# Altium footprint library 04.连接器件.pcb.PCBLIB: 363 footprints (part 12 of 23)
Each footprint in its own frame and in the unit in brackets; x right, y up, seen from the top. Pads: shape width x height; smd on the part's side, far side on the other; paste and mask are expansions set on the pad; w line width, h text height; cw(c..) or ccw(c..) is an arc to the next point about the centre after c.
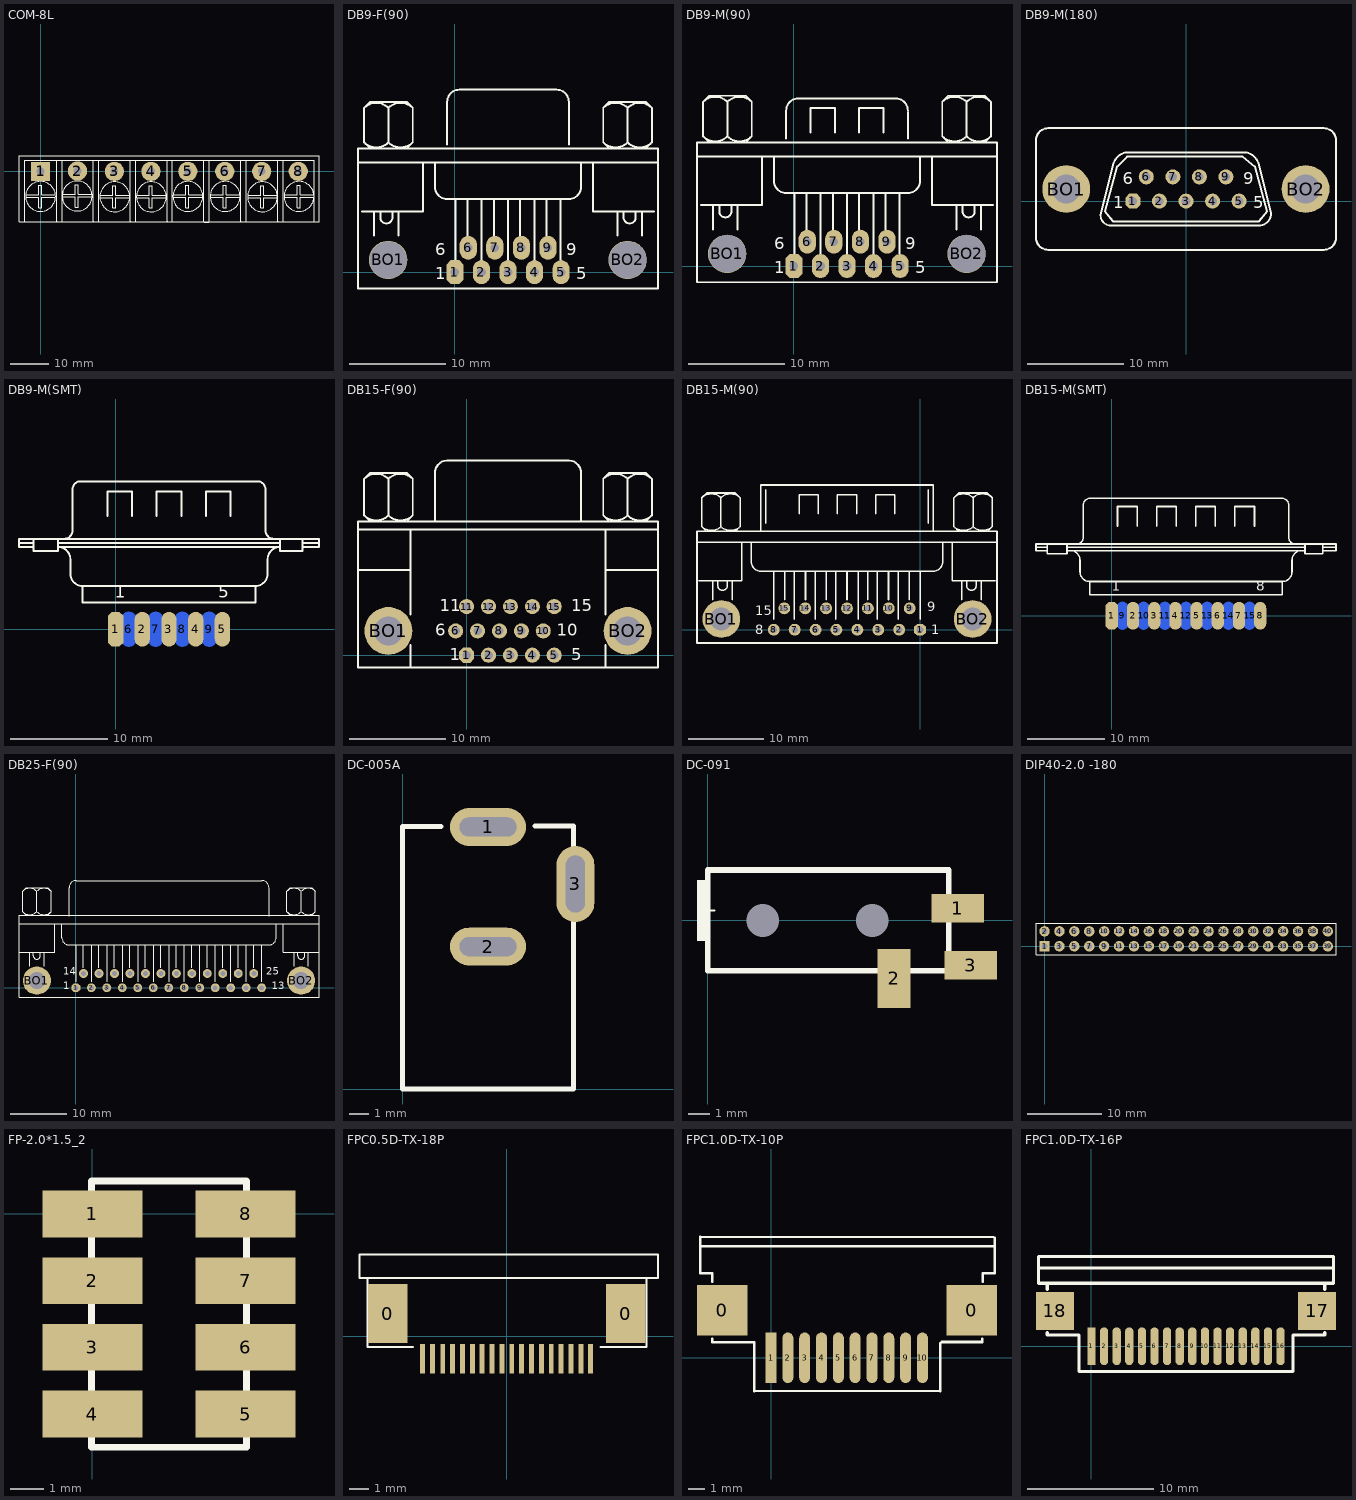
[diagram p11: the footprints below, top view; thin cyan lines are the x and y axes]

## COM-8L [mm]
pads (8):
  rect 5x5 hole 2: 1(0,0)
  round 5 hole 2: 2(9.6,0.1) 3(19.2,0) 4(28.7,0) 5(38.3,0) 6(47.9,0) 7(57.5,0) 8(67,0)
TopOverlay:
  drawing of 177 lines, arcs and shapes, not listed

## DB9-F(90) [mm]
pads (11):
  oct 1.8x2.5 hole 0.9: 1(0,0)
  oval 1.8x2.5 hole 0.9: 2(2.773,0) 3(5.546,0) 4(8.318,0) 5(11.091,0) 6(1.397,2.54) 7(4.17,2.54) 8(6.943,2.54) 9(9.715,2.54)
  round 4 hole 3.9: BO1(-6.964,1.27) BO2(18.034,1.27)
TopOverlay:
  lines w0.203: -10.118,11.43 21.209,11.43 ; -9.694,6.35 -3.344,6.35 -3.344,11.43 ; -9.485,13.544 ccw(c-8.213,14.817) -6.94,13.544 ; -9.485,17.147 cw(c-8.213,15.875) -6.94,17.147 ; -8.848,12.912 -9.483,13.547 -9.483,17.145 -8.848,17.78 -5.038,17.78 -4.403,17.145 -4.403,13.547 -5.038,12.912 ; -8.424,3.81 -8.424,6.35 ; -7.789,6.35 -7.789,5.715 ccw(c-7.154,5.715) -6.519,5.715 -6.519,6.35 ; -6.945,13.544 ccw(c-5.673,14.817) -4.4,13.544 ; -6.945,17.147 cw(c-5.673,15.875) -4.4,17.147 ; -6.943,13.547 -6.943,17.145 ; -5.884,3.81 -5.884,6.35 ; -2.074,11.43 -2.074,8.89 ccw(c-0.804,8.89) -0.804,7.62 11.896,7.62 ccw(c11.896,8.89) 13.166,8.89 13.166,11.43 ; -0.804,13.335 -0.804,17.78 cw(c0.466,17.78) 0.466,19.05 10.626,19.05 cw(c10.626,17.78) 11.896,17.78 11.896,13.335 ; 0.042,1.27 0.042,7.62 ; 1.312,3.81 1.312,7.62 ; 2.794,1.27 2.794,7.62 ; 4.064,3.81 4.064,7.62 ; 5.546,1.27 5.546,7.62 ; 6.816,3.81 6.816,7.62 ; 8.297,1.27 8.297,7.62 ; 9.567,3.81 9.567,7.62 ; 11.049,1.27 11.049,7.62 ; 14.436,11.43 14.436,6.35 20.786,6.35 ; 15.492,13.544 ccw(c16.764,14.817) 18.036,13.544 ; 15.492,17.147 cw(c16.764,15.875) 18.036,17.147 ; 16.129,12.912 15.494,13.547 15.494,17.145 16.129,17.78 19.939,17.78 20.574,17.145 20.574,13.547 19.939,12.912 ; 16.976,3.81 16.976,6.35 ; 17.611,6.35 17.611,5.715 ccw(c18.246,5.715) 18.881,5.715 18.881,6.35 ; 18.032,13.544 ccw(c19.304,14.817) 20.576,13.544 ; 18.032,17.147 cw(c19.304,15.875) 20.576,17.147 ; 18.034,13.547 18.034,17.145 ; 19.516,3.81 19.516,6.35 ; -10.118,-1.693 -10.118,12.912 21.209,12.912 21.209,-1.693 -10.118,-1.693
  text "6" at -2.074,1.778 h1.27
  text "1" at -2.074,-0.762 h1.27
  text "5" at 12.658,-0.762 h1.27
  text "9" at 11.642,1.778 h1.27
3D body "DB9-FL.STEP": height 12.55, standoff -3, extent -10.058,-1.727 21.252,16.673

## DB9-M(90) [mm]
pads (11):
  oct 1.8x2.5 hole 0.9: 1(0,0)
  oval 1.8x2.5 hole 0.9: 2(2.773,0) 3(5.546,0) 4(8.318,0) 5(11.091,0) 6(1.397,2.54) 7(4.17,2.54) 8(6.943,2.54) 9(9.715,2.54)
  round 4 hole 3.9: BO1(-6.964,1.27) BO2(18.034,1.27)
TopOverlay:
  lines w0.203: -10.118,11.43 21.209,11.43 ; -9.694,6.35 -3.344,6.35 -3.344,11.43 ; -9.485,13.544 ccw(c-8.213,14.817) -6.94,13.544 ; -9.485,17.147 cw(c-8.213,15.875) -6.94,17.147 ; -8.848,12.912 -9.483,13.547 -9.483,17.145 -8.848,17.78 -5.038,17.78 -4.403,17.145 -4.403,13.547 -5.038,12.912 ; -8.424,3.81 -8.424,6.35 ; -7.789,6.35 -7.789,5.715 ccw(c-7.154,5.715) -6.519,5.715 -6.519,6.35 ; -6.945,13.544 ccw(c-5.673,14.817) -4.4,13.544 ; -6.945,17.147 cw(c-5.673,15.875) -4.4,17.147 ; -6.943,13.547 -6.943,17.145 ; -5.884,3.81 -5.884,6.35 ; -2.074,11.43 -2.074,8.89 ccw(c-0.804,8.89) -0.804,7.62 11.896,7.62 ccw(c11.896,8.89) 13.166,8.89 13.166,11.43 ; -0.804,13.335 -0.804,16.231 cw(c0.466,16.231) 0.466,17.501 10.626,17.501 cw(c10.626,16.231) 11.896,16.231 ; 0.042,1.27 0.042,7.62 ; 1.312,3.81 1.312,7.62 ; 1.736,13.966 1.736,16.506 4.276,16.506 4.276,13.966 ; 2.794,1.27 2.794,7.62 ; 4.064,3.81 4.064,7.62 ; 5.546,1.27 5.546,7.62 ; 6.816,3.81 6.816,7.62 ; 6.816,13.966 6.816,16.506 9.356,16.506 9.356,13.966 ; 8.297,1.27 8.297,7.62 ; 9.567,3.81 9.567,7.62 ; 11.049,1.27 11.049,7.62 ; 11.896,13.335 11.896,16.104 ; 14.436,11.43 14.436,6.35 20.786,6.35 ; 15.492,13.544 ccw(c16.764,14.817) 18.036,13.544 ; 15.492,17.147 cw(c16.764,15.875) 18.036,17.147 ; 16.129,12.912 15.494,13.547 15.494,17.145 16.129,17.78 19.939,17.78 20.574,17.145 20.574,13.547 19.939,12.912 ; 16.976,3.81 16.976,6.35 ; 17.611,6.35 17.611,5.715 ccw(c18.246,5.715) 18.881,5.715 18.881,6.35 ; 18.032,13.544 ccw(c19.304,14.817) 20.576,13.544 ; 18.032,17.147 cw(c19.304,15.875) 20.576,17.147 ; 18.034,13.547 18.034,17.145 ; 19.516,3.81 19.516,6.35 ; -10.118,-1.693 -10.118,12.912 21.209,12.912 21.209,-1.693 -10.118,-1.693
  text "6" at -2.074,1.778 h1.27
  text "1" at -2.074,-0.762 h1.27
  text "5" at 12.658,-0.762 h1.27
  text "9" at 11.642,1.778 h1.27
3D body "DB9-ML.STEP": height 12.55, standoff -3, extent -10.08,-1.678 21.234,17.122

## DB9-M(180) [mil]
pads (11):
  oct 62x62 hole 35: 1(-218.33,0)
  round 62 hole 35: 2(-109.17,0) 3(0,0) 4(109.17,0) 5(218.33,0) 6(-163.33,100) 7(-54.17,100) 8(55,100) 9(164.17,100)
  round 196.67 hole 118.33: BO1(-492.5,50) BO2(491.67,50)
TopOverlay:
  lines w8: -350.05,-50.22 ccw(c-308.33,-58.33) -300.22,-100.05 ; -350,-50 -300,150 ; -300,-100 300,-100 ccw(c300,-50) 350,-50 300,150 ; -299.64,149.86 cw(c-233.33,133.33) -249.86,199.64 ; -250,200 250,200 ; 249.86,199.64 cw(c233.33,133.33) 299.64,149.86 ; -616.67,-150 ccw(c-566.67,-150) -566.67,-200 566.67,-200 ccw(c566.67,-150) 616.67,-150 616.67,250 ccw(c566.67,250) 566.67,300 -566.67,300 ccw(c-566.67,250) -616.67,250 -616.67,-150 ; -333.33,-41.67 -283.33,141.67 -241.67,183.33 233.33,183.33 283.33,141.67 333.33,-41.67 300,-83.33 -300,-83.33 -333.33,-41.67
  text "1" at -300,-30 h50
  text "5" at 276.3,-29.7 h50
  text "6" at -260,70 h50
  text "9" at 235.7,70.2 h50
3D body "DB9-M.STEP": height 480.31, standoff -117.72, extent -625,-204.81 622.64,307

## DB9-M(SMT) [mil]
pads (9):
  oct 62.5x141.67 smd: 1(0,0)
  oval 62.5x141.67 smd: 2(108.33,0) 3(216.67,0) 4(325,0) 5(433.33,0)
  oval 62.5x141.67 smd far side: 6(54.17,0) 7(162.5,0) 8(270.83,0) 9(379.17,0)
TopOverlay:
  lines w8: -391.67,350 -333.33,350 ; -333.33,333.33 -391.67,333.33 -391.67,366.67 825,366.67 825,333.33 758.33,333.33 ; -333.33,366.67 -333.33,316.67 -233.33,316.67 -233.33,366.67 ; -233.33,350 666.67,350 ; -208.33,366.67 ccw(c-208.33,400) -175,400 -175,566.67 cw(c-141.67,566.67) -141.67,600 575,600 cw(c575,566.67) 608.33,566.67 608.33,400 ccw(c641.67,400) 641.67,366.67 ; -33.33,458.33 -33.33,558.33 66.67,558.33 66.67,458.33 ; 166.67,458.33 166.67,558.33 266.67,558.33 266.67,458.33 ; 366.67,458.33 366.67,558.33 466.67,558.33 466.67,458.33 ; 666.67,366.67 666.67,316.67 758.33,316.67 758.33,366.67 ; 758.33,350 825,350 ; -133.33,175 cw(c-133.33,225) -183.33,225 -183.33,283.33 ccw(c-233.33,283.33) -233.33,333.33 666.67,333.33 ccw(c666.67,283.33) 616.67,283.33 616.67,225 cw(c566.67,225) 566.67,175 ; -133.33,175 -133.33,108.33 566.67,108.33 566.67,175 ; -133.33,175 566.67,175
  text "1" at -3.33,128.33 h50
  text "5" at 416.67,128.33 h50
3D body "DB9-M.STEP": height 239.37, standoff -272.44, extent -409,-1 838.64,597.03

## DB15-F(90) [mil]
pads (17):
  oct 62x62 hole 35: 1(0,0)
  round 62 hole 35: 2(90,0) 3(180,0) 4(270,0) 5(360,0) 6(-45,100) 7(45,100) 8(135,100) 9(225,100) 10(315,100) 11(0,200) 12(90,200) 13(180,200) 14(270,200) 15(360,200)
  round 196.67 hole 118.33: BO1(-321.67,100) BO2(661.67,100)
TopOverlay:
  lines w8: -446.67,350 -230,350 ; -446.67,516.67 786.67,516.67 ; -421.75,574.91 ccw(c-371.67,625) -321.58,574.91 ; -421.75,725.09 cw(c-371.67,675) -321.58,725.09 ; -396.67,550 -421.67,575 -421.67,725 -396.67,750 -246.67,750 -221.67,725 -221.67,575 -246.67,550 ; -321.75,574.91 ccw(c-271.67,625) -221.58,574.91 ; -321.75,725.09 cw(c-271.67,675) -221.58,725.09 ; -321.67,575 -321.67,725 ; -230,-50 -230,41.67 ; -230,166.67 -230,350 ; -230,516.67 -230,350 ; -130,550 -130,750 cw(c-80,750) -80,800 420,800 cw(c420,750) 470,750 470,550 ; 561.58,574.91 ccw(c611.67,625) 661.75,574.91 ; 561.58,725.09 cw(c611.67,675) 661.75,725.09 ; 570,-50 570,41.67 ; 570,166.67 570,350 ; 570,516.67 570,350 ; 586.67,550 561.67,575 561.67,725 586.67,750 736.67,750 761.67,725 761.67,575 736.67,550 ; 661.58,574.91 ccw(c711.67,625) 761.75,574.91 ; 661.58,725.09 cw(c711.67,675) 761.75,725.09 ; 661.67,575 661.67,725 ; 786.67,350 570,350 ; -446.67,-50 786.67,-50 786.67,550 -446.67,550 -446.67,-50
  text "1" at -70,-20 h50
  text "6" at -130,80 h50
  text "11" at -110,180 h50
  text "15" at 430,180 h50
  text "10" at 370,80 h50
  text "5" at 430,-20 h50
3D body "SW3dPS-Connector, D-Sub, 15 pin HD, RA, Receptacle.STEP": height 502.95, standoff -128.94, extent -438.5,-40 774.5,790.71

## DB15-M(90) [mil]
pads (17):
  oct 62x62 hole 35: 1(0,0)
  round 62 hole 35: 2(-109.17,0) 3(-218.33,0) 4(-327.5,0) 5(-436.67,0) 6(-545.83,0) 7(-655,0) 8(-764.17,0) 9(-54.17,111.67) 10(-163.33,111.67) 11(-272.5,111.67) 12(-381.67,111.67) 13(-490.83,111.67) 14(-600,111.67) 15(-709.17,111.67)
  round 196.67 hole 118.33: BO1(-1037.5,55.83) BO2(274.17,55.83)
TopOverlay:
  lines w8: -1165,455.83 401.67,455.83 ; -1156.67,255.83 -931.67,255.83 -931.67,455.83 ; -1140.09,539.08 ccw(c-1090,589.17) -1039.91,539.08 ; -1140.09,689.25 cw(c-1090,639.17) -1039.91,689.25 ; -1115,514.17 -1140,539.17 -1140,689.17 -1115,714.17 -965,714.17 -940,689.17 -940,539.17 -965,514.17 ; -1081.67,155.83 -1081.67,255.83 ; -1056.67,255.83 -1056.67,230.83 ccw(c-1031.67,230.83) -1006.67,230.83 -1006.67,255.83 ; -1040.09,539.08 ccw(c-990,589.17) -939.91,539.08 ; -1040.09,689.25 cw(c-990,639.17) -939.91,689.25 ; -1040,539.17 -1040,689.17 ; -981.67,155.83 -981.67,255.83 ; -881.67,455.83 -881.67,355.83 ccw(c-831.67,355.83) -831.67,305.83 68.33,305.83 ccw(c68.33,355.83) 118.33,355.83 118.33,455.83 ; -831.67,514.17 -831.67,755.83 68.33,755.83 68.33,514.17 ; -806.67,555.83 -806.67,730.83 ; -765,55.83 -765,305.83 ; -706.67,155.83 -706.67,305.83 ; -656.67,55.83 -656.67,305.83 ; -631.67,605.83 -631.67,705.83 -531.67,705.83 -531.67,605.83 ; -598.33,155.83 -598.33,305.83 ; -548.33,55.83 -548.33,305.83 ; -490,155.83 -490,305.83 ; -440,55.83 -440,305.83 ; -431.67,605.83 -431.67,705.83 -331.67,705.83 -331.67,605.83 ; -381.67,155.83 -381.67,305.83 ; -323.33,55.83 -323.33,305.83 ; -273.33,155.83 -273.33,305.83 ; -231.67,605.83 -231.67,705.83 -131.67,705.83 -131.67,605.83 ; -223.33,55.83 -223.33,305.83 ; -165,155.83 -165,305.83 ; -115,55.83 -115,305.83 ; -56.67,155.83 -56.67,305.83 ; 1.67,55.83 1.67,305.83 ; 43.33,555.83 43.33,730.83 ; 168.33,455.83 168.33,255.83 368.33,255.83 393.33,255.83 ; 176.58,539.08 ccw(c226.67,589.17) 276.75,539.08 ; 176.58,689.25 cw(c226.67,639.17) 276.75,689.25 ; 201.67,514.17 176.67,539.17 176.67,689.17 201.67,714.17 351.67,714.17 376.67,689.17 376.67,539.17 351.67,514.17 ; 218.33,155.83 218.33,255.83 ; 243.33,255.83 243.33,230.83 ccw(c268.33,230.83) 293.33,230.83 293.33,255.83 ; 276.58,539.08 ccw(c326.67,589.17) 376.75,539.08 ; 276.58,689.25 cw(c326.67,639.17) 376.75,689.25 ; 276.67,539.17 276.67,689.17 ; 318.33,155.83 318.33,255.83 ; -1165,-69.17 -1165,514.17 401.67,514.17 401.67,-69.17 -1165,-69.17
  text "9" at 38.33,95.83 h50
  text "1" at 58.33,-24.17 h50
  text "8" at -861.67,-24.17 h50
  text "15" at -861.67,75.83 h50

## DB15-M(SMT) [mil]
pads (15):
  oct 62.5x141.67 smd: 1(0,0)
  oval 62.5x141.67 smd: 2(108.33,0) 3(216.67,0) 4(325,0) 5(433.33,0) 6(541.67,0) 7(650,0) 8(758.33,0)
  oval 62.5x141.67 smd far side: 9(54.17,0) 10(162.5,0) 11(270.83,0) 12(379.17,0) 13(487.5,0) 14(595.83,0) 15(704.17,0)
TopOverlay:
  lines w8: -387.5,350 -329.17,350 ; -329.17,333.33 -387.5,333.33 -387.5,366.67 1145.83,366.67 1145.83,333.33 1079.17,333.33 ; -329.17,366.67 -329.17,316.67 -229.17,316.67 -229.17,366.67 ; -229.17,333.33 987.5,333.33 ; -229.17,350 987.5,350 ; -212.5,333.33 cw(c-212.5,283.33) -162.5,283.33 -162.5,225 ccw(c-112.5,225) -112.5,175 ; -179.17,366.67 ccw(c-179.17,400) -145.83,400 -145.83,566.67 cw(c-112.5,566.67) -112.5,600 870.83,600 cw(c870.83,566.67) 904.16,566.67 904.17,400 ccw(c937.5,400) 937.5,366.67 ; 29.17,458.33 29.17,558.33 129.17,558.33 129.17,458.33 ; 229.17,458.33 229.17,558.33 329.17,558.33 329.17,458.33 ; 429.17,458.33 429.17,558.33 529.17,558.33 529.17,458.33 ; 629.17,458.33 629.17,558.33 729.17,558.33 729.17,458.33 ; 970.83,333.33 ccw(c970.83,283.33) 920.83,283.33 920.83,225 cw(c870.83,225) 870.83,175 ; 987.5,366.67 987.5,316.67 1079.17,316.67 1079.17,366.67 ; 1079.17,350 1145.83,350 ; -112.5,175 -112.5,108.33 870.83,108.33 870.83,175 ; -112.5,175 870.83,175
  text "1" at -0.83,128.33 h50
  text "8" at 739.17,128.33 h50

## DB25-F(90) [mil]
pads (27):
  oct 62x62 hole 35: 1(0,0)
  round 62 hole 35: 2(108.33,0) 3(216.67,0) 4(325,0) 5(433.33,0) 6(541.67,0) 7(650,0) 8(758.33,0) 9(866.67,0) 10(975,0) 11(1083.33,0) 12(1191.67,0) 13(1300,0) 14(53.33,100) 15(161.67,100) 16(270,100) 17(378.33,100) 18(486.67,100) 19(595,100) 20(703.33,100) 21(811.67,100) 22(920,100) 23(1028.33,100) 24(1136.67,100) 25(1245,100)
  round 196.67 hole 118.33: BO1(-273.33,50) BO2(1576.67,50)
TopOverlay:
  lines w8: -398.33,250 -148.33,250 -148.33,450 ; -398.33,450 1701.67,450 ; -373.42,533.25 ccw(c-323.33,583.33) -273.25,533.25 ; -373.42,675.09 cw(c-323.33,625) -273.25,675.09 ; -348.33,508.33 -373.33,533.33 -373.33,675 -348.33,700 -198.33,700 -173.33,675 -173.33,533.33 -198.33,508.33 ; -323.33,150 -323.33,250 ; -298.33,250 -298.33,225 ccw(c-273.33,225) -248.33,225 -248.33,250 ; -273.42,533.25 ccw(c-223.33,583.33) -173.25,533.25 ; -273.42,675.09 cw(c-223.33,625) -173.25,675.09 ; -273.33,533.33 -273.33,675 ; -223.33,150 -223.33,250 ; -98.33,450 -98.33,350 ccw(c-48.33,350) -48.33,300 1351.67,300 ccw(c1351.67,350) 1401.67,350 1401.67,450 ; -48.33,500 -48.33,700 cw(c1.67,700) 1.67,750 1301.67,750 cw(c1301.67,700) 1351.67,700 1351.67,500 ; 1.67,41.67 1.67,300 ; 51.67,141.67 51.67,300 ; 110,41.67 110,300 ; 160,141.67 160,300 ; 218.33,41.67 218.33,300 ; 268.33,141.67 268.33,300 ; 326.67,41.67 326.67,300 ; 376.67,141.67 376.67,300 ; 435,41.67 435,300 ; 485,141.67 485,300 ; 543.33,41.67 543.33,300 ; 593.33,141.67 593.33,300 ; 651.67,41.67 651.67,300 ; 701.67,141.67 701.67,300 ; 760,41.67 760,300 ; 810,141.67 810,300 ; 868.33,41.67 868.33,300 ; 918.33,141.67 918.33,300 ; 976.67,41.67 976.67,300 ; 1026.67,141.67 1026.67,300 ; 1085,41.67 1085,300 ; 1135,141.67 1135,300 ; 1193.33,41.67 1193.33,300 ; 1243.33,141.67 1243.33,300 ; 1301.67,41.67 1301.67,300 ; 1451.67,450 1451.67,250 1701.67,250 ; 1476.58,533.25 ccw(c1526.67,583.33) 1576.75,533.25 ; 1476.58,675.09 cw(c1526.67,625) 1576.75,675.09 ; 1501.67,508.33 1476.67,533.33 1476.67,675 1501.67,700 1651.67,700 1676.67,675 1676.67,533.33 1651.67,508.33 ; 1526.67,150 1526.67,250 ; 1551.67,250 1551.67,225 ccw(c1576.67,225) 1601.67,225 1601.67,250 ; 1576.58,533.25 ccw(c1626.67,583.33) 1676.75,533.25 ; 1576.58,675.09 cw(c1626.67,625) 1676.75,675.09 ; 1576.67,533.33 1576.67,675 ; 1626.67,150 1626.67,250 ; -398.33,-66.67 -398.33,508.33 1701.67,508.33 1701.67,-66.67 -398.33,-66.67
  text "13" at 1371.67,-10 h50
  text "25" at 1331.67,90 h50
  text "14" at -88.33,90 h50
  text "1" at -88.33,-10 h50

## DC-005A [mm]
pads (3):
  oval 4x2 hole 1 slot 3 at 0 deg: 1(4.5,13.8) 2(4.5,7.5)
  oval 2x4 hole 1 slot 3 at 90 deg: 3(9.1,10.8)
TopOverlay:
  lines w0.254: 2.018,13.818 0,13.818 0,0 9,0 9,8.8 ; 6.957,13.843 9,13.843 9,12.8
3D body "User Library-dc range - dc connector[4840_2201].STEP": height 11.02, standoff -3.48, extent -0.003,0.017 9.503,13.843

## DC-091 [mm]
pads (5):
  round 0 hole 1.5 mask+0: 0(2.5,0) 0(7.5,0)
  rect 2.4x1.3 smd: 1(11.4,0.55) 3(12,-2.05)
  rect 1.5x2.7 smd: 2(8.5,-2.65)
TopOverlay:
  rectangle: -0.5,-0.95 0.1,1.85
  lines w0.1: -0.2,0.45 0.3,0.45
  lines w0.254: 0,-2.3 0,2.3 11,2.3 11,-2.3 0,-2.3
3D body "DC.STEP": height 4.4, standoff -0.8, extent 0.025,-3.875 12.625,2.425

## DIP40-2.0 -180 [mm]
pads (40):
  rect 1.4x1.4 hole 0.75: 1(0,0)
  round 1.4 hole 0.75: 2(0,2) 3(2,0) 4(2,2) 5(4,0) 6(4,2) 7(6,0) 8(6,2) 9(8,0) 10(8,2) 11(10,0) 12(10,2) 13(12,0) 14(12,2) 15(14,0) 16(14,2) 17(16,0) 18(16,2) 19(18,0) 20(18,2) 21(20,0) 22(20,2) 23(22,0) 24(22,2) 25(24,0) 26(24,2) 27(26,0) 28(26,2) 29(28,0) 30(28,2) 31(30,0) 32(30,2) 33(32,0) 34(32,2) 35(34,0) 36(34,2) 37(36,0) 38(36,2) 39(38,0) 40(38,2)
TopOverlay:
  lines w0.1: -1.143,-1.118 39.091,-1.118 39.091,3.073 -1.143,3.073 -1.143,-1.118
3D body "DIP40(2.0)排针.": height 8, standoff -2.6, extent -1.067,-1.016 38.933,2.984

## FP-2.0*1.5_2 [mm]
pads (8):
  rect 3x1.4 smd: 1(0,0) 2(0,-2) 3(0,-4) 4(0,-6) 5(4.6,-6) 6(4.6,-4) 7(4.6,-2) 8(4.6,0)
TopOverlay:
  lines w0.2: -0.025,-7 -0.025,0.991 4.623,0.991 4.623,-7 -0.025,-7

## FPC0.5D-TX-18P [mm]
pads (20):
  rect 2x3 smd: 0(-6.036,1.146) 0(6.036,1.146)
  rect 0.25x1.5 smd: 1(-4.258,-1.146) 2(-3.75,-1.146) 3(-3.242,-1.146) 4(-2.742,-1.146) 5(-2.242,-1.146) 6(-1.742,-1.146) 7(-1.242,-1.146) 8(-0.742,-1.146) 9(-0.242,-1.146) 10(0.258,-1.146) 11(0.758,-1.146) 12(1.258,-1.146) 13(1.758,-1.146) 14(2.258,-1.146) 15(2.758,-1.146) 16(3.258,-1.146) 17(3.758,-1.146) 18(4.258,-1.146)
TopOverlay:
  lines w0.1: -7.066,2.946 -7.066,-0.554 -4.758,-0.554 ; 4.742,-0.554 7.094,-0.554 7.094,2.946 ; -7.461,2.946 -7.461,4.146 7.669,4.146 7.669,2.946 -7.461,2.946
3D body: height 2.5, standoff 0, extent -7.461,-0.554 7.669,4.146

## FPC1.0D-TX-10P [mm]
pads (12):
  rect 3x3 smd: 0(-2.899,2.822) 0(11.929,2.819)
  rect 0.65x3 smd: 1(0,0)
  oval 0.65x3 smd: 2(1,0) 3(2,0) 4(3,0) 5(4,0) 6(5,0) 7(6,0) 8(7,0) 9(8,0) 10(9,0)
TopOverlay:
  lines w0.127: -4.208,7.188 13.225,7.188 ; -4.183,6.629 13.291,6.629 ; -0.999,-1.978 10.045,-1.978
  lines w0.15: -4.208,7.188 -4.199,5.022 -3.499,5.022 -3.499,4.522 ; -3.499,1.122 -3.499,0.922 -0.999,0.922 -0.999,-1.978 ; 10.049,-1.981 10.049,0.838 10.151,0.94 12.564,0.94 12.564,1.143 ; 12.591,4.514 12.591,5.022 13.291,5.022 13.291,7.122

## FPC1.0D-TX-16P [mm]
pads (18):
  rect 0.65x3 smd: 1(0,0)
  oval 0.65x3 smd: 2(1,0) 3(2,0) 4(3,0) 5(4,0) 6(5,0) 7(6,0) 8(7,0) 9(8,0) 10(9,0) 11(10,0) 12(11,0) 13(12,0) 14(13,0) 15(14,0) 16(15,0)
  rect 3x3 smd: 17(17.9,2.8) 18(-2.9,2.8)
TopOverlay:
  lines w0.254: -4.2,6.2 19.191,6.188 ; -3.5,1.1 -3.5,0.9 -1,0.9 -1,-2 16,-2 16,0.9 18.5,0.9 18.5,1.1 ; -3.5,4.5 -3.5,5 -4.2,5 ; 18.5,4.492 18.5,5 19.2,5 ; 19.188,7.112 -4.191,7.112 -4.2,5 ; 19.2,7.1 19.2,5 ; -4.2,5 19.2,5